# Altium footprint library ZLS_Lib.PcbLib: 157 footprints (part 8 of 10)
Each footprint in its own frame and in the unit in brackets; x right, y up, seen from the top. Pads: shape width x height; smd on the part's side, far side on the other; paste and mask are expansions set on the pad; w line width, h text height; cw(c..) or ccw(c..) is an arc to the next point about the centre after c.
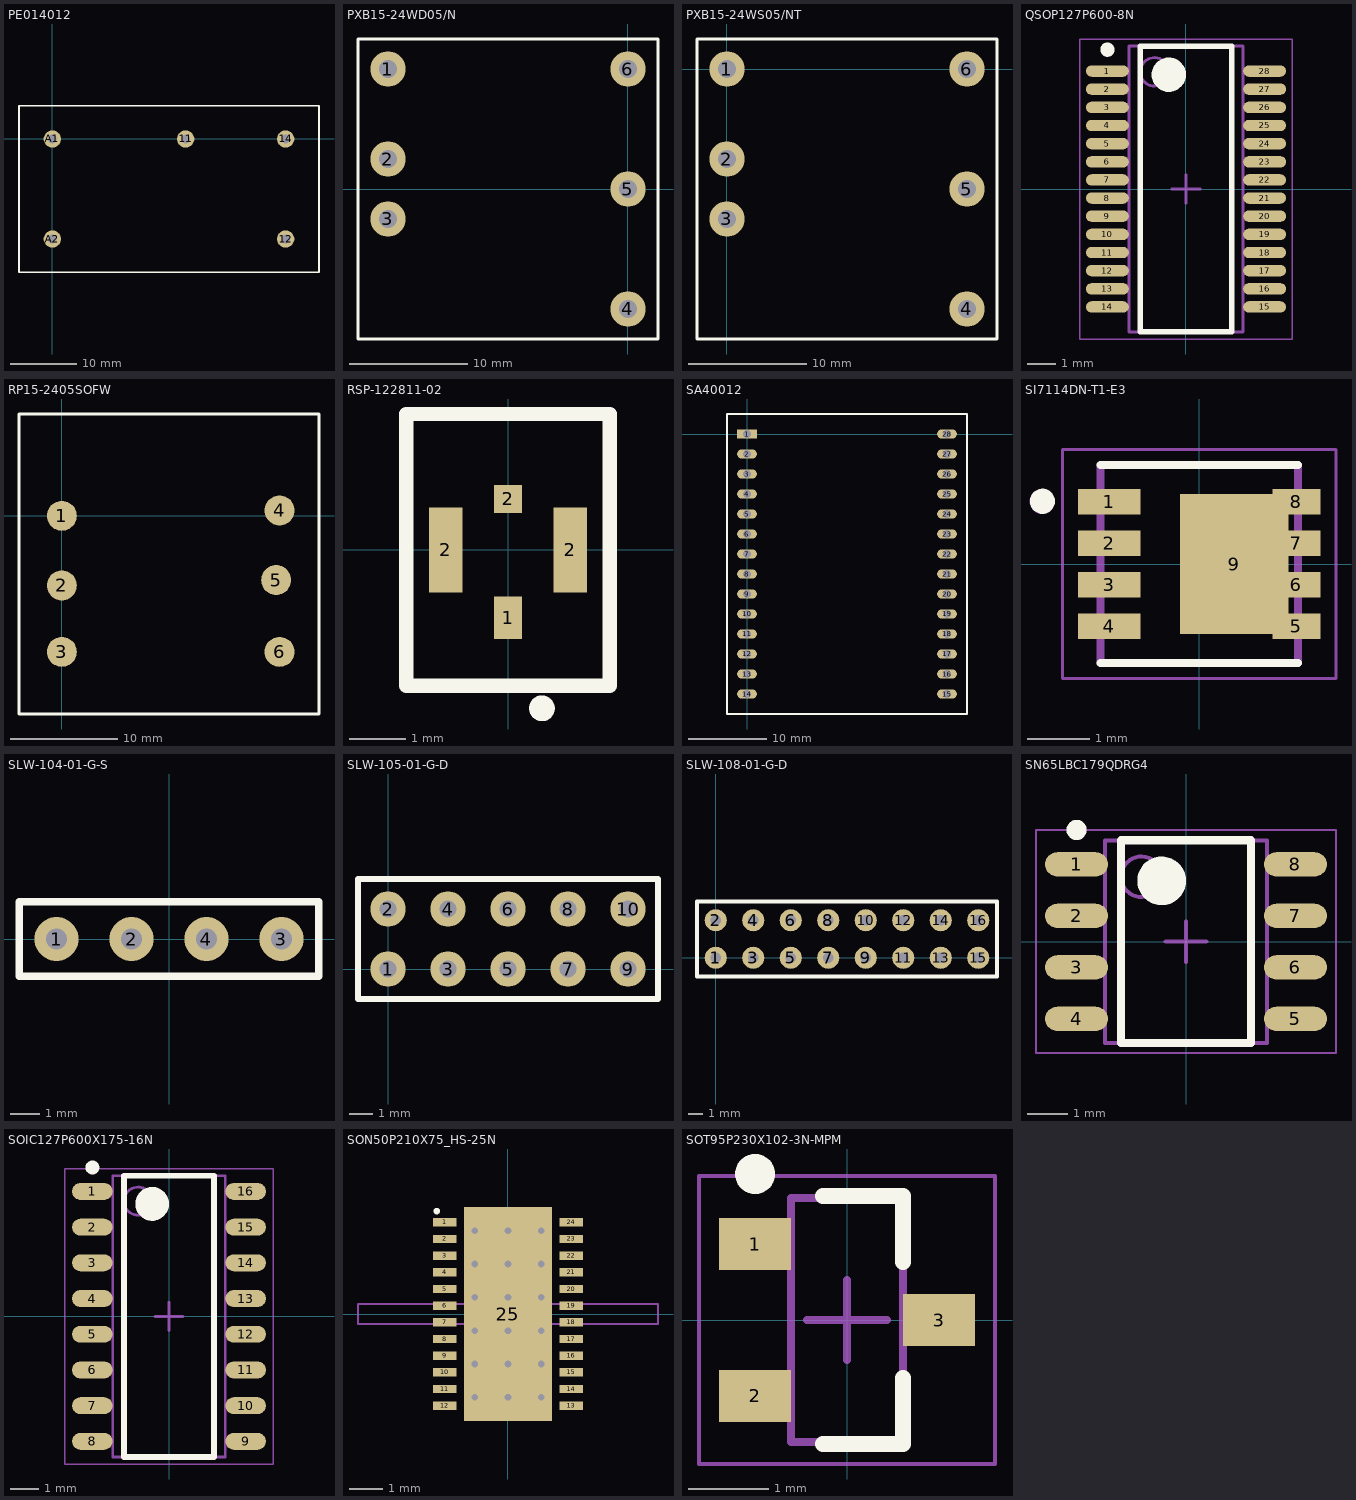
[diagram p7: the footprints below, top view; thin cyan lines are the x and y axes]

## PE014012 [mm] "Relay"
height 10
pads (5):
  round 2.6 hole 1.3: 11(20,0) 12(35,-15) 14(35,0) A1(0,0) A2(0,-15)
Top Overlay:
  lines w0.254: -5,-20 40,-20 40,5 -5,5 -5,-20
3D body: height 10, standoff 0, extent -1.402,-16.402 36.402,1.402
3D body: height 10, standoff 0, extent -5.127,-20.127 40.127,5.127
3D body: height 10, standoff 0, extent -4.999,-19.999 39.999,4.999
3D body: height 10, standoff 0, extent -5.127,-20.127 40.127,5.127

## PXB15-24WD05/N [mm] "DC-DC CONV 15W DUAL 5V"
height 9.9
pads (6):
  round 3 hole 1.5: 1(-20.32,10.16) 2(-20.32,2.54) 3(-20.32,-2.54) 4(0,-10.16) 5(0,0) 6(0,10.16)
Top Overlay:
  lines w0.254: -22.86,-12.7 2.54,-12.7 2.54,12.7 -22.86,12.7 -22.86,-12.7
3D body: height 9.9, standoff 0, extent -22.987,-12.827 2.667,12.827
3D body: height 9.9, standoff 0, extent -22.859,-12.699 2.539,12.699
3D body: height 9.9, standoff 0, extent -22.987,-12.827 2.667,12.827
3D body: height 9.9, standoff 0, extent -21.422,-11.262 1.102,11.262
3D body: height 9.9, standoff 0, extent -22.987,-12.827 2.667,12.827
3D body: height 9.9, standoff 0, extent -22.859,-12.699 2.539,12.699
3D body: height 9.9, standoff 0, extent -22.987,-12.827 2.667,12.827
3D body: height 9.9, standoff 0, extent -21.422,-11.262 1.102,11.262
3D body: height 9.9, standoff 0, extent -22.987,-12.827 2.667,12.827
3D body: height 9.9, standoff 0, extent -22.859,-12.699 2.539,12.699
3D body: height 9.9, standoff 0, extent -22.987,-12.827 2.667,12.827
3D body: height 9.9, standoff 0, extent -21.422,-11.262 1.102,11.262

## PXB15-24WS05/NT [mm] "DC-DC Converter 5V 3A 15W"
height 10
pads (6):
  round 3 hole 1.5: 1(0,0) 2(0,-7.62) 3(0,-12.7) 4(20.32,-20.32) 5(20.32,-10.16) 6(20.32,0)
Top Overlay:
  lines w0.254: -2.54,-22.86 -2.54,2.54 22.86,2.54 22.86,-22.86 -2.54,-22.86
3D body: height 9.9, standoff 0, extent -1.102,-21.422 21.422,1.102
3D body: height 9.9, standoff 0, extent -2.667,-22.987 22.987,2.667
3D body: height 9.9, standoff 0, extent -2.539,-22.859 22.859,2.539
3D body: height 9.9, standoff 0, extent -2.667,-22.987 22.987,2.667
3D body: height 9.9, standoff 0, extent -1.102,-21.422 21.422,1.102
3D body: height 9.9, standoff 0, extent -2.667,-22.987 22.987,2.667
3D body: height 9.9, standoff 0, extent -2.539,-22.859 22.859,2.539
3D body: height 9.9, standoff 0, extent -2.667,-22.987 22.987,2.667
3D body: height 9.9, standoff 0, extent -1.102,-21.422 21.422,1.102
3D body: height 9.9, standoff 0, extent -2.667,-22.987 22.987,2.667
3D body: height 9.9, standoff 0, extent -2.539,-22.859 22.859,2.539
3D body: height 9.9, standoff 0, extent -2.667,-22.987 22.987,2.667

## QSOP127P600-8N [mm]
height 1.75
pads (28):
  oval 1.5x0.4 smd: 1(-2.75,4.127) 2(-2.75,3.492) 3(-2.75,2.857) 4(-2.75,2.222) 5(-2.75,1.587) 6(-2.75,0.953) 7(-2.75,0.318) 8(-2.75,-0.318) 9(-2.75,-0.953) 10(-2.75,-1.587) 11(-2.75,-2.222) 12(-2.75,-2.857) 13(-2.75,-3.492) 14(-2.75,-4.127) 15(2.75,-4.127) 16(2.75,-3.492) 17(2.75,-2.857) 18(2.75,-2.222) 19(2.75,-1.587) 20(2.75,-0.953) 21(2.75,-0.318) 22(2.75,0.318) 23(2.75,0.953) 24(2.75,1.587) 25(2.75,2.222) 26(2.75,2.857) 27(2.75,3.492) 28(2.75,4.127)
Top Overlay:
  circle w0.6: c-0.6,4 r0.3
  circle w0.25: c-2.75,4.878 r0.125
  lines w0.2: -1.6,-5 1.6,-5 1.6,5 -1.6,5 -1.6,-5
Mechanical 13:
  circle w0.1: c-1.1,4.1 r0.5
  lines w0.1: -2,-5 2,-5 2,5 -2,5 -2,-5
Mechanical 15:
  lines w0.05: -3.725,-5.25 3.725,-5.25 3.725,5.25 -3.725,5.25 -3.725,-5.25
  lines w0.1: -0.5,0 0.5,0 ; 0,-0.5 0,0.5
3D body: height 1.75, standoff 0, extent -3.01,-5 3.01,5

## RP15-2405SOFW [mm] "CONV DC/DC 15W 9-36VIN 05VOUT"
height 8.5
pads (6):
  round 2.8 smd: 1(0,0) 2(0,-6.5) 3(0,-12.7) 4(20.32,0.5) 5(20,-6) 6(20.32,-12.7)
Top Overlay:
  lines w0.254: -4,-18.5 24,-18.5 24,9.5 -4,9.5 -4,-18.5
3D body: height 8.5, standoff 1, extent 4,-13 16,9
3D body: height 3, standoff 2.3, extent -4,-18.5 24,9.5

## RSP-122811-02 [mm]
pads (4):
  rect 0.5x0.75 smd: 1(0,-1.2)
  rect 0.6x1.5 smd: 2(-1.1,0) 2(1.1,0)
  rect 0.5x0.5 smd: 2(0,0.9)
Top Overlay:
  circle w0.254: c0.6,-2.8 r0.1
  lines w0.254: -1.8,-2.4 1.8,-2.4 1.8,2.4 -1.8,2.4 -1.8,-2.4

## SA40012 [mm]
pads (28):
  rect 2.5x1.2 hole 1.016: 1(0,0)
  oval 2.5x1.2 hole 1.016: 2(0,-2.54) 3(0,-5.08) 4(0,-7.62) 5(0,-10.16) 6(0,-12.7) 7(0,-15.24) 8(0,-17.78) 9(0,-20.32) 10(0,-22.86) 11(0,-25.4) 12(0,-27.94) 13(0,-30.48) 14(0,-33.02) 15(25.4,-33.02) 16(25.4,-30.48) 17(25.4,-27.94) 18(25.4,-25.4) 19(25.4,-22.86) 20(25.4,-20.32) 21(25.4,-17.78) 22(25.4,-15.24) 23(25.4,-12.7) 24(25.4,-10.16) 25(25.4,-7.62) 26(25.4,-5.08) 27(25.4,-2.54) 28(25.4,0)
Top Overlay:
  lines w0.2: -2.54,-35.56 27.94,-35.56 27.94,2.54 14.605,2.54 12.7,2.54 10.795,2.54 -2.54,2.54 -2.54,-35.56

## SFSD-30-28 [mm]
3D body "_SFSD_30_p_6.sldprt": height 1.12, standoff -0.15, extent -18.898,0 18.898,10.16
3D body "_SFSD_30_p_6.sldprt": height -0.23, standoff -1.5, extent -18.898,0 18.898,10.16
3D body "_SFSD_30_28_S_b_2.sldprt": height 3.17, standoff -3.17, extent -19.241,0 19.241,11.176
3D body "_SFSD_30_28_D_NUS_ca_4.sldprt": height 1.17, standoff -1.17, extent -18.948,-7 18.948,0.112

## SI7114DN-T1-E3 [mm]
pads (9):
  rect 0.99x0.405 smd: 1(-1.435,0.99) 2(-1.435,0.33) 3(-1.435,-0.33) 4(-1.435,-0.99)
  rect 0.76x0.405 smd: 5(1.55,-0.99) 6(1.55,-0.33) 7(1.55,0.33) 8(1.55,0.99)
  rect 1.725x2.235 smd: 9(0.557,0)
Top Overlay:
  circle w0.2: c-2.5,1 r0.1
  lines w0.127: -1.575,-1.575 1.575,-1.575 ; -1.575,1.575 1.575,1.575
Mechanical 4:
  circle w0.2: c-2.502,0.997 r0.1
  circle w0.2: c-2.502,0.997 r0.1
  lines w0.127: -1.575,-1.575 -1.575,1.575 ; -1.575,-1.575 1.575,-1.575 ; -1.575,-1.575 -1.575,1.575 ; -1.575,-1.575 1.575,-1.575 ; -1.575,1.575 1.575,1.575 ; -1.575,1.575 1.575,1.575 ; 1.575,-1.575 1.575,1.575 ; 1.575,-1.575 1.575,1.575
Mechanical 16:
  lines w0.05: -2.18,-1.825 -2.18,1.825 2.18,1.825 2.18,-1.825 -2.18,-1.825

## SLW-104-01-G-S [mm]
pads (4):
  round 1.5 hole 0.71: 1(-3.81,0) 2(-1.27,0) 3(3.81,0) 4(1.27,0)
Top Overlay:
  lines w0.254: -5.08,-1.27 -5.08,1.27 5.08,1.27 5.08,-1.27 -5.08,-1.27
3D body "_C_28_01_04_S_4.sldprt": height 3.81, standoff -2.92, extent -4.826,-0.889 4.826,0.889
3D body "_SLW_104_01_S_socket_2.sldprt": height 4.57, standoff 0, extent -5.08,-1.27 5.08,1.27

## SLW-105-01-G-D [mm]
pads (10):
  round 1.5 hole 0.71: 1(0,0) 2(0,2.54) 3(2.54,0) 4(2.54,2.54) 5(5.08,0) 6(5.08,2.54) 7(7.62,0) 8(7.62,2.54) 9(10.16,0) 10(10.16,2.54)
Top Overlay:
  lines w0.254: -1.27,-1.27 -1.27,3.81 11.43,3.81 11.43,-1.27 -1.27,-1.27
3D body "_C_28_01_05_D_4.sldprt": height 3.81, standoff -2.92, extent -1.016,-0.762 11.176,3.429
3D body "_SLW_105_01_D_socket_2.sldprt": height 4.57, standoff 0, extent -1.27,-1.27 11.43,3.683

## SLW-108-01-G-D [mm]
height 6
pads (16):
  round 1.5 hole 0.71: 1(0,0) 2(0,2.54) 3(2.54,0) 4(2.54,2.54) 5(5.08,0) 6(5.08,2.54) 7(7.62,0) 8(7.62,2.54) 9(10.16,0) 10(10.16,2.54) 11(12.7,0) 12(12.7,2.54) 13(15.24,0) 14(15.24,2.54) 15(17.78,0) 16(17.78,2.54)
Top Overlay:
  lines w0.254: -1.27,-1.27 19.05,-1.27 19.05,3.81 -1.27,3.81 -1.27,-1.27
3D body "_SLW_108_01_D_socket_2.sldprt": height 4.57, standoff 0, extent -1.27,-1.27 19.05,3.683
3D body "_C_28_01_08_D_4.sldprt": height 3.81, standoff -2.92, extent -1.016,-0.825 18.796,3.365

## SN65LBC179QDRG4 [mm]
height 1.75
pads (8):
  oval 1.55x0.6 smd: 1(-2.7,1.905) 2(-2.7,0.635) 3(-2.7,-0.635) 4(-2.7,-1.905) 5(2.7,-1.905) 6(2.7,-0.635) 7(2.7,0.635) 8(2.7,1.905)
Top Overlay:
  circle w0.6: c-0.6,1.5 r0.3
  circle w0.25: c-2.7,2.755 r0.125
  lines w0.2: -1.6,-2.5 1.6,-2.5 1.6,2.5 -1.6,2.5 -1.6,-2.5
Mechanical 13:
  circle w0.1: c-1.1,1.6 r0.5
  lines w0.1: -2,-2.5 2,-2.5 2,2.5 -2,2.5 -2,-2.5
Mechanical 15:
  lines w0.05: -3.7,-2.75 3.7,-2.75 3.7,2.75 -3.7,2.75 -3.7,-2.75
  lines w0.1: -0.5,0 0.5,0 ; 0,-0.5 0,0.5
3D body "SN65LBC179QDRG4.step": height 1.75, standoff 0, extent -3,-2.5 3,2.5

## SOIC127P600X175-16N [mm] "SOIC, 16-Leads, Body 9.90x3.90mm, Pitch 1.27mm, IPC Medium Density"
height 1.75
pads (16):
  oval 1.45x0.6 smd: 1(-2.725,4.445) 2(-2.725,3.175) 3(-2.725,1.905) 4(-2.725,0.635) 5(-2.725,-0.635) 6(-2.725,-1.905) 7(-2.725,-3.175) 8(-2.725,-4.445) 9(2.725,-4.445) 10(2.725,-3.175) 11(2.725,-1.905) 12(2.725,-0.635) 13(2.725,0.635) 14(2.725,1.905) 15(2.725,3.175) 16(2.725,4.445)
Top Overlay:
  circle w0.25: c-2.725,5.295 r0.125
  circle w0.6: c-0.6,4 r0.3
  lines w0.2: -1.6,-5 -1.6,5 1.6,5 1.6,-5 -1.6,-5
Mechanical 13:
  circle w0.1: c-1.1,4.1 r0.5
  lines w0.1: -2,-5 -2,5 2,5 2,-5 -2,-5
Mechanical 15:
  lines w0.05: -3.7,-5.25 -3.7,5.25 3.7,5.25 3.7,-5.25 -3.7,-5.25
  lines w0.1: -0.5,0 0.5,0 ; 0,-0.5 0,0.5
3D body: height 1.75, standoff 0, extent -3,-5 3,5

## SON50P210X75_HS-25N [mm] "SON, 24-Leads, Body 3.55x2.05mm, Pitch 0.50mm, Thermal Pad 6.43x2.59mm, IPC Medium Density"
height 0.75
pads (25):
  rect 0.7x0.25 smd: 1(-1.9,2.75) 2(-1.9,2.25) 3(-1.9,1.75) 4(-1.9,1.25) 5(-1.9,0.75) 6(-1.9,0.25) 7(-1.9,-0.25) 8(-1.9,-0.75) 9(-1.9,-1.25) 10(-1.9,-1.75) 11(-1.9,-2.25) 12(-1.9,-2.75) 13(1.9,-2.75) 14(1.9,-2.25) 15(1.9,-1.75) 16(1.9,-1.25) 17(1.9,-0.75) 18(1.9,-0.25) 19(1.9,0.25) 20(1.9,0.75) 21(1.9,1.25) 22(1.9,1.75) 23(1.9,2.25) 24(1.9,2.75)
  rect 2.64x6.43 smd paste-1.295: 25(0,0)
via -1,2.5 diameter 0.5 hole 0.2
via 0,2.5 diameter 0.5 hole 0.2
via 1,2.5 diameter 0.5 hole 0.2
via -1,1.5 diameter 0.5 hole 0.2
via 0,1.5 diameter 0.5 hole 0.2
via 1,1.5 diameter 0.5 hole 0.2
via -1,0.5 diameter 0.5 hole 0.2
via 0,0.5 diameter 0.5 hole 0.2
via 1,0.5 diameter 0.5 hole 0.2
via -1,-0.5 diameter 0.5 hole 0.2
via 0,-0.5 diameter 0.5 hole 0.2
via 1,-0.5 diameter 0.5 hole 0.2
via -1,-1.5 diameter 0.5 hole 0.2
via 0,-1.5 diameter 0.5 hole 0.2
via 1,-1.5 diameter 0.5 hole 0.2
via -1,-2.5 diameter 0.5 hole 0.2
via 0,-2.5 diameter 0.5 hole 0.2
via 1,-2.5 diameter 0.5 hole 0.2
Top Overlay:
  circle w0.1: c-2.137,3.087 r0.05
Top Paste:
  rectangle: -1.2,2.035 -0.1,3.125
  rectangle: -1.2,0.745 -0.1,1.835
  rectangle: -1.2,-0.545 -0.1,0.545
  rectangle: -1.2,-1.835 -0.1,-0.745
  rectangle: -1.2,-3.125 -0.1,-2.035
  rectangle: 0.1,2.035 1.2,3.125
  rectangle: 0.1,0.745 1.2,1.835
  rectangle: 0.1,-0.545 1.2,0.545
  rectangle: 0.1,-1.835 1.2,-0.745
  rectangle: 0.1,-3.125 1.2,-2.035
Mechanical 13:
  lines w0.1: -0.05,-0.05 -0.05,0.05 0.05,0.05 0.05,-0.05 -0.05,-0.05
Mechanical 15:
  lines w0.05: -4.5,-0.3 -4.5,0.3 4.5,0.3 4.5,-0.3 -4.5,-0.3
  lines w0.1: -0.5,0 0.5,0 ; 0,-0.5 0,0.5
3D body: height 0.75, standoff 0, extent -1.32,-3.215 1.32,3.215

## SOT95P230X102-3N-MPM [mm] "SOT23, 3-Leads, Body 2.86x2.30mm, Pitch 0.95mm, IPC Medium Density"
height 1.02
pads (3):
  rect 0.9x0.65 smd: 1(-1.15,0.95) 2(-1.15,-0.95) 3(1.15,0)
Top Overlay:
  circle w0.25: c-1.15,1.825 r0.125
  lines w0.2: -0.3,-1.55 0.7,-1.55 0.7,-0.725 ; -0.3,1.55 0.7,1.55 0.7,0.725
Mechanical 13:
  lines w0.1: -0.7,-1.525 0.7,-1.525 0.7,1.525 -0.7,1.525 -0.7,-1.525
Mechanical 15:
  lines w0.05: -1.85,-1.8 1.85,-1.8 1.85,1.8 -1.85,1.8 -1.85,-1.8
  lines w0.1: -0.5,0 0.5,0 ; 0,-0.5 0,0.5
3D body: height 1.02, standoff 0, extent -1.32,-1.525 1.32,1.525